# Altium schematic symbol library Schlib.SchLib: 725 symbols (part 5 of 6) (continued)
## SN74LVC1G06DCKR
designator U?  (value not drawn)
Inverter IC 1 Channel Open Drain SC-70-5; Manufacturer: Texas Instruments; Manufacturer Part Number: SN74LVC1G06DCKR; Logic Function: Buffer,Inverting; Number of Inputs: 1; Max Supply Voltage: 5.5V; Min Supply Voltage: 1.65V; Propagation Delay: 3ns; Quiescent Current: 10uA; Low Level Output Current: 32mA; Polarity: Inverting; Turn-On Delay Time: 6.5ns; Supplier: Digi-Key; Supplier Part Number: 296-8484-1-ND; RoHS: Yes; Category: Buffers, Drivers and Transceivers; Stock: 365; Pricing: 1=0.38000, 10=0.31100, 25=0.26040, 100=0.16490, 250=0.12728, 500=0.10848, 1000=0.07376 (USD); Mounting Technology: Surface Mount; Case/Package: SC; Pins: 5; Contact Plating: Gold; Min Operating Temperature: -40°C; Max Operating Temperature: 125°C; Packaging: Tape and Reel; Package Quantity: 3000; Number of Circuits: 1; Number of Elements: 1; Number of Gates: 1; Number of Bits: 1; Series: 74LVC; Technology: CMOS; Number of Channels: 1; Number of Outputs: 1; Number of Input Lines: 1; Number of Output Lines: 1; Output Current: 32mA; High Level Output Current: 32mA; Number of Bits per Element: 1; Length: 2mm; Width: 1.25mm; Height: 0.9mm; Radiation Hardening: No; Lead Free: Lead Free; RoHS Compliant: Yes; Reach SVHC Compliant: Yes; ComponentLink1URL: https://datasheet.ciiva.com/34301/1043820-34301914.pdf?src-supplier=Jameco; ComponentLink1Description: https://datasheet.ciiva.com/34301/1043820-34301914.pdf?src-supplier=Jameco; ComponentLink2URL: https://datasheet.ciiva.com/15094/getdatasheetpartid-76668-15094547.pdf?src-supplier=Verical; ComponentLink2Description: https://datasheet.ciiva.com/15094/getdatasheetpartid-76668-15094547.pdf?src-supplier=Verical; ComponentLink3URL: https://datasheet.ciiva.com/7783/1633749-7783590.pdf?src-supplier=Element14; ComponentLink3Description: https://datasheet.ciiva.com/7783/1633749-7783590.pdf?src-supplier=Element14; ComponentLink4URL: https://datasheet.ciiva.com/46442/1857056-46442057.pdf?src-supplier=Element14; ComponentLink4Description: https://datasheet.ciiva.com/46442/1857056-46442057.pdf?src-supplier=Element14; ComponentLink5URL: https://datasheet.ciiva.com/1864/sn74lvc1g06-1864402.pdf?src-supplier=Digi-Key; ComponentLink5Description: https://datasheet.ciiva.com/1864/sn74lvc1g06-1864402.pdf?src-supplier=Digi-Key; ComponentLink6URL: https://datasheet.ciiva.com/1864/sn74lvc1g06-1864401.pdf?src-supplier=Digi-Key; ComponentLink6Description: https://datasheet.ciiva.com/1864/sn74lvc1g06-1864401.pdf?src-supplier=Digi-Key; ComponentLink7URL: https://datasheet.ciiva.com/1864/sn74lvc1g06-1864403.pdf?src-supplier=Digi-Key; ComponentLink7Description: https://datasheet.ciiva.com/1864/sn74lvc1g06-1864403.pdf?src-supplier=Digi-Key
footprint SC-70-5
pins: 1 NC, 2 IN, 3 GND, 4 OUT, 5 VDD

## SN74LVC1G14QDCKRQ1
designator U?
Automotive single 1.65-V to 5.5-V inverter with Schmitt-Trigger inputs 5-SC70 -40 to 125; Manufacturer: Texas Instruments; Manufacturer Part Number: SN74LVC1G14QDCKRQ1; Manufacturer Lifecycle Status: ACTIVE; High Level Output Current: 32mA; Number of Bits: 1; Propagation Delay: 6ns; Quiescent Current: 10µA; Supplier: Arrow Electronics; Supplier Part Number: SN74LVC1G14QDCKRQ1; RoHS: Compliant; Category: Logic Gates; Stock: 6000; Pricing: 3000=0.1184, 6000=0.1097 (USD); Height: 1.1mm; Lead Free: Lead Free; Length: 2mm; Lifecycle Status: Production; Logic Function: Inverter; Low Level Output Current: 32mA; Max Operating Temperature: 125°C; Min Operating Temperature: -40°C; Mounting Technology: Surface Mount; Number of Channels: 1; Number of Circuits: 1; Number of Inputs: 1; Number of Outputs: 1; Pins: 5; Packaging: Tape & Reel (TR); Schedule B: 8542390000; Thickness: 900µm; Width: 1.25mm; ComponentLink1URL: https://sigma.octopart.com:443/182282879/technical_drawing/Texas-Instruments-SN74LVC1G14QDCKRQ1.pdf?src-supplier=Texas+Instruments; ComponentLink1Description: https://sigma.octopart.com:443/182282879/technical_drawing/Texas-Instruments-SN74LVC1G14QDCKRQ1.pdf?src-supplier=Texas+Instruments; ComponentLink2URL: https://octopart.com:443/opatz8j6/c1?t=U1LMfQ56LyeyUG5Y4b6cngpQ5JkKyWGfgRvG9hLlQAWevraWS6dPVHoKD8UD42W17Ftg6QB904-I0RVjOt0vzRvqwagTP4tDRJEozQC8SMRx5pi6hHnU7hc6kQ0D0ugqyMBQWFLFIEd4Bknu6ewOwAUrQRkAodPNYxL-9mlNF-WlI8emsuFFNSkNGoJA9xeI0UkoxdXIukTa1c4BW7cp62KtBfKQTgFwx6a1twekbOYut9D9a9xfIV4LmNRg1ArGnMB1Zd4pKakrJIcb0nauSqbMuVdvadi7FrMB_1zO3pMxSr5NQpaXCcOnIT5BmSZUZ496w0UnMKb4XmwBOW_kvpePxWxk2_q0hsWCR3bKlWY2bjyXu1ZEOVibRalMkkX6ztmV34tRU0Y171_2&src-supplier=Texas+Instruments; ComponentLink2Description: https://octopart.com:443/opatz8j6/c1?t=U1LMfQ56LyeyUG5Y4b6cngpQ5JkKyWGfgRvG9hLlQAWevraWS6dPVHoKD8UD42W17Ftg6QB904-I0RVjOt0vzRvqwagTP4tDRJEozQC8SMRx5pi6hHnU7hc6kQ0D0ugqyMBQWFLFIEd4Bknu6ewOwAUrQRkAodPNYxL-9mlNF-WlI8emsuFFNSkNGoJA9xeI0UkoxdXIukTa1c4BW7cp62KtBfKQTgFwx6a1twekbOYut9D9a9xfIV4LmNRg1ArGnMB1Zd4pKakrJIcb0nauSqbMuVdvadi7FrMB_1zO3pMxSr5NQpaXCcOnIT5BmSZUZ496w0UnMKb4XmwBOW_kvpePxWxk2_q0hsWCR3bKlWY2bjyXu1ZEOVibRalMkkX6ztmV34tRU0Y171_2&src-supplier=Texas+Instruments; ComponentLink3URL: https://sigma.octopart.com:443/179129132/technical_drawing/Texas-Instruments-SN74LVC1G14QDCKRQ1.pdf?src-supplier=Texas+Instruments; ComponentLink3Description: https://sigma.octopart.com:443/179129132/technical_drawing/Texas-Instruments-SN74LVC1G14QDCKRQ1.pdf?src-supplier=Texas+Instruments; ComponentLink4URL: https://sigma.octopart.com:443/176385615/technical_drawing/Texas-Instruments-SN74LVC1G14QDCKRQ1.pdf?src-supplier=Texas+Instruments; ComponentLink4Description: https://sigma.octopart.com:443/176385615/technical_drawing/Texas-Instruments-SN74LVC1G14QDCKRQ1.pdf?src-supplier=Texas+Instruments; ComponentLink5URL: https://sigma.octopart.com:443/169406035/technical_drawing/Texas-Instruments-SN74LVC1G14QDCKRQ1.pdf?src-supplier=Texas+Instruments; ComponentLink5Description: https://sigma.octopart.com:443/169406035/technical_drawing/Texas-Instruments-SN74LVC1G14QDCKRQ1.pdf?src-supplier=Texas+Instruments; ComponentLink6URL: https://datasheet.octopart.com:443/SN74LVC1G14QDCKRQ1-Texas-Instruments-datasheet-37538580.pdf?src-supplier=Texas+Instruments; ComponentLink6Description: https://datasheet.octopart.com:443/SN74LVC1G14QDCKRQ1-Texas-Instruments-datasheet-37538580.pdf?src-supplier=Texas+Instruments; ComponentLink7URL: https://sigma.octopart.com:443/49249326/technical_drawing/Texas-Instruments-SN74LVC1G14QDCKRQ1.pdf?src-supplier=Texas+Instruments; ComponentLink7Description: https://sigma.octopart.com:443/49249326/technical_drawing/Texas-Instruments-SN74LVC1G14QDCKRQ1.pdf?src-supplier=Texas+Instruments; ComponentLink8URL: https://datasheet.octopart.com:443/SN74LVC1G14QDCKRQ1-Texas-Instruments-datasheet-164417655.pdf?src-supplier=SHENGYU+ELECTRONICS; ComponentLink8Description: https://datasheet.octopart.com:443/SN74LVC1G14QDCKRQ1-Texas-Instruments-datasheet-164417655.pdf?src-supplier=SHENGYU+ELECTRONICS; ComponentLink9URL: https://datasheet.octopart.com:443/SN74LVC1G14QDCKRQ1-Texas-Instruments-datasheet-163726857.pdf?src-supplier=LCSC; ComponentLink9Description: https://datasheet.octopart.com:443/SN74LVC1G14QDCKRQ1-Texas-Instruments-datasheet-163726857.pdf?src-supplier=LCSC; ComponentLink10URL: https://datasheet.octopart.com:443/SN74LVC1G14QDCKRQ1-Texas-Instruments-datasheet-142046494.pdf?src-supplier=Arrow.cn; ComponentLink10Description: https://datasheet.octopart.com:443/SN74LVC1G14QDCKRQ1-Texas-Instruments-datasheet-142046494.pdf?src-supplier=Arrow.cn; ComponentLink11URL: http://sigma.octopart.com:80/reach_statement/Texas-Instruments-company-64.pdf?src-supplier=Compliance+Statements; ComponentLink11Description: http://sigma.octopart.com:80/reach_statement/Texas-Instruments-company-64.pdf?src-supplier=Compliance+Statements; ComponentLink12URL: http://sigma.octopart.com:80/conflict_mineral_statement/Texas-Instruments-company-63.pdf?src-supplier=Compliance+Statements; ComponentLink12Description: http://sigma.octopart.com:80/conflict_mineral_statement/Texas-Instruments-company-63.pdf?src-supplier=Compliance+Statements
footprint DCK5_TEX
pins: 1 NC, 2 IN (in), 3 GND, 4 OUT (out), 5 VCC

## SN74LVC1G32DCKT
designator U?
1-ch, 2-input 1.65-V to 5.5-V 32-mA drive strength OR gate 5-SC70 -40 to 125; Manufacturer: Texas Instruments; Manufacturer Part Number: SN74LVC1G32DCKT; Manufacturer Lifecycle Status: ACTIVE; Frequency: 100MHz; High Level Output Current: -32mA; Low Level Output Current: 32mA; Max Junction Temperature (Tj): 150°C; Max Supply Voltage: 5.5V; Min Supply Voltage: 1.65V; Nominal Supply Current: 10µA; Number of Bits: 1; Number of Input Lines: 2; Operating Supply Voltage: 3.3V; Propagation Delay: 4.5ns; Schmitt Trigger Input: No; Supplier: Mouser; Supplier Part Number: 595-SN74LVC1G32DCKT; RoHS: Compliant; Category: Logic Gates; Stock: 1631; Pricing: 1=0.83, 10=0.59, 50=0.531, 100=0.466, 1000=0.384, 10000=0.363 (USD); Ambient Temperature Range High: 125°C; Case/Package: SC; Contact Plating: Gold; Height: 1.1mm; Lead Free: Lead Free; Length: 2mm; Lifecycle Status: Production; Logic Function: OR; Max Operating Temperature: 125°C; Max Output current: 32mA; Min Operating Temperature: -40°C; Mounting Technology: Surface Mount; Number of Channels: 1; Number of Circuits: 1; Number of Elements: 1; Number of Gates: 1; Number of Inputs: 2; Number of Output Lines: 1; Number of Outputs: 1; Pins: 5; Output Current: 32mA; Quiescent Current: 10µA; Radiation Hardening: No; REACH SVHC: No; Schedule B: 8542390000, 8542390000|8542390000|8542390000|8542390000|8542390000; Termination: SMD/SMT; Thickness: 900µm; Turn-On Delay Time: 4.5ns; Weight: 2.494758mg; Width: 1.25mm; ComponentLink1URL: https://sigma.octopart.com:443/182282879/technical_drawing/Texas-Instruments-SN74LVC1G32DCKT.pdf?src-supplier=Texas+Instruments; ComponentLink1Description: https://sigma.octopart.com:443/182282879/technical_drawing/Texas-Instruments-SN74LVC1G32DCKT.pdf?src-supplier=Texas+Instruments; ComponentLink2URL: https://octopart.com:443/opatz8j6/c1?t=rAITI4QwbW4FpwhT6HFWelN2Gah5uZ4XhCUEPN3mm1eiMsylUgdGbohF32qWzQW7A6NoWiLBGkQ81fWadFdnS6BCCWdna0BhpcwqqO3gXsfgtYNZFvbCFYsA3GKbVc_B0BliRUpCimSoX7Rd0nZdHLR4ot09PzmCO6Vl8HQzUZsOgWN7xof43mk2YXqqYknWkDaj1UjTN54UqNcYeshF40Mv3zEu1_pPM2oLBoc8u8ZahoYKBYbjBr1lnNnXB-W3mThCqVs9PNfg4zqWgOsFbQJfVtYn74HA1rX7MA0pUxWkGOXsGdj1hS1oov9Vxb8hZ-5jVVrJvH-msINucWBGyi1HtkDZ0bsHVZRz9zflGjuwobzqfU56h-aLiWVlLVHo3nlkGm60ULw&src-supplier=Texas+Instruments; ComponentLink2Description: https://octopart.com:443/opatz8j6/c1?t=rAITI4QwbW4FpwhT6HFWelN2Gah5uZ4XhCUEPN3mm1eiMsylUgdGbohF32qWzQW7A6NoWiLBGkQ81fWadFdnS6BCCWdna0BhpcwqqO3gXsfgtYNZFvbCFYsA3GKbVc_B0BliRUpCimSoX7Rd0nZdHLR4ot09PzmCO6Vl8HQzUZsOgWN7xof43mk2YXqqYknWkDaj1UjTN54UqNcYeshF40Mv3zEu1_pPM2oLBoc8u8ZahoYKBYbjBr1lnNnXB-W3mThCqVs9PNfg4zqWgOsFbQJfVtYn74HA1rX7MA0pUxWkGOXsGdj1hS1oov9Vxb8hZ-5jVVrJvH-msINucWBGyi1HtkDZ0bsHVZRz9zflGjuwobzqfU56h-aLiWVlLVHo3nlkGm60ULw&src-supplier=Texas+Instruments; ComponentLink3URL: https://sigma.octopart.com:443/179129132/technical_drawing/Texas-Instruments-SN74LVC1G32DCKT.pdf?src-supplier=Texas+Instruments; ComponentLink3Description: https://sigma.octopart.com:443/179129132/technical_drawing/Texas-Instruments-SN74LVC1G32DCKT.pdf?src-supplier=Texas+Instruments; ComponentLink4URL: https://sigma.octopart.com:443/176385615/technical_drawing/Texas-Instruments-SN74LVC1G32DCKT.pdf?src-supplier=Texas+Instruments; ComponentLink4Description: https://sigma.octopart.com:443/176385615/technical_drawing/Texas-Instruments-SN74LVC1G32DCKT.pdf?src-supplier=Texas+Instruments; ComponentLink5URL: https://sigma.octopart.com:443/169406035/technical_drawing/Texas-Instruments-SN74LVC1G32DCKT.pdf?src-supplier=Texas+Instruments; ComponentLink5Description: https://sigma.octopart.com:443/169406035/technical_drawing/Texas-Instruments-SN74LVC1G32DCKT.pdf?src-supplier=Texas+Instruments; ComponentLink6URL: https://datasheet.octopart.com:443/SN74LVC1G32DCKT-Texas-Instruments-datasheet-24565372.pdf?src-supplier=Texas+Instruments; ComponentLink6Description: https://datasheet.octopart.com:443/SN74LVC1G32DCKT-Texas-Instruments-datasheet-24565372.pdf?src-supplier=Texas+Instruments; ComponentLink7URL: https://datasheet.octopart.com:443/SN74LVC1G32DCKT-Texas-Instruments-datasheet-16617162.pdf?src-supplier=Texas+Instruments; ComponentLink7Description: https://datasheet.octopart.com:443/SN74LVC1G32DCKT-Texas-Instruments-datasheet-16617162.pdf?src-supplier=Texas+Instruments; ComponentLink8URL: https://datasheet.octopart.com:443/SN74LVC1G32DCKT-Texas-Instruments-datasheet-15994557.pdf?src-supplier=Texas+Instruments; ComponentLink8Description: https://datasheet.octopart.com:443/SN74LVC1G32DCKT-Texas-Instruments-datasheet-15994557.pdf?src-supplier=Texas+Instruments; ComponentLink9URL: https://datasheet.octopart.com:443/SN74LVC1G32DCKT-Texas-Instruments-datasheet-13041517.pdf?src-supplier=Texas+Instruments; ComponentLink9Description: https://datasheet.octopart.com:443/SN74LVC1G32DCKT-Texas-Instruments-datasheet-13041517.pdf?src-supplier=Texas+Instruments; ComponentLink10URL: https://datasheet.octopart.com:443/SN74LVC1G32DCKT-Texas-Instruments-datasheet-11479365.pdf?src-supplier=Texas+Instruments; ComponentLink10Description: https://datasheet.octopart.com:443/SN74LVC1G32DCKT-Texas-Instruments-datasheet-11479365.pdf?src-supplier=Texas+Instruments; ComponentLink11URL: https://datasheet.octopart.com:443/SN74LVC1G32DCKT-Texas-Instruments-datasheet-10884951.pdf?src-supplier=Texas+Instruments; ComponentLink11Description: https://datasheet.octopart.com:443/SN74LVC1G32DCKT-Texas-Instruments-datasheet-10884951.pdf?src-supplier=Texas+Instruments; ComponentLink12URL: https://datasheet.octopart.com:443/SN74LVC1G32DCKT-Texas-Instruments-datasheet-10627501.pdf?src-supplier=Texas+Instruments; ComponentLink12Description: https://datasheet.octopart.com:443/SN74LVC1G32DCKT-Texas-Instruments-datasheet-10627501.pdf?src-supplier=Texas+Instruments; ComponentLink13URL: https://datasheet.octopart.com:443/SN74LVC1G32DCKT-Texas-Instruments-datasheet-152691.pdf?src-supplier=Texas+Instruments; ComponentLink13Description: https://datasheet.octopart.com:443/SN74LVC1G32DCKT-Texas-Instruments-datasheet-152691.pdf?src-supplier=Texas+Instruments; ComponentLink14URL: https://sigma.octopart.com:443/49249326/technical_drawing/Texas-Instruments-SN74LVC1G32DCKT.pdf?src-supplier=Texas+Instruments; ComponentLink14Description: https://sigma.octopart.com:443/49249326/technical_drawing/Texas-Instruments-SN74LVC1G32DCKT.pdf?src-supplier=Texas+Instruments; ComponentLink15URL: https://datasheet.octopart.com:443/SN74LVC1G32DCKT-Texas-Instruments-datasheet-149157257.pdf?src-supplier=Upverter; ComponentLink15Description: https://datasheet.octopart.com:443/SN74LVC1G32DCKT-Texas-Instruments-datasheet-149157257.pdf?src-supplier=Upverter; ComponentLink16URL: https://datasheet.octopart.com:443/SN74LVC1G32DCKT-Texas-Instruments-datasheet-65713484.pdf?src-supplier=Newark; ComponentLink16Description: https://datasheet.octopart.com:443/SN74LVC1G32DCKT-Texas-Instruments-datasheet-65713484.pdf?src-supplier=Newark; ComponentLink17URL: https://datasheet.octopart.com:443/SN74LVC1G32DCKT-Texas-Instruments-datasheet-547111.pdf?src-supplier=Newark; ComponentLink17Description: https://datasheet.octopart.com:443/SN74LVC1G32DCKT-Texas-Instruments-datasheet-547111.pdf?src-supplier=Newark; ComponentLink18URL: https://datasheet.octopart.com:443/SN74LVC1G32DCKT-Texas-Instruments-datasheet-21259391.pdf?src-supplier=Newark; ComponentLink18Description: https://datasheet.octopart.com:443/SN74LVC1G32DCKT-Texas-Instruments-datasheet-21259391.pdf?src-supplier=Newark; ComponentLink19URL: https://datasheet.octopart.com:443/SN74LVC1G32DCKT-Texas-Instruments-datasheet-10408086.pdf?src-supplier=Newark; ComponentLink19Description: https://datasheet.octopart.com:443/SN74LVC1G32DCKT-Texas-Instruments-datasheet-10408086.pdf?src-supplier=Newark; ComponentLink20URL: https://datasheet.octopart.com:443/SN74LVC1G32DCKT-Texas-Instruments-datasheet-8772557.pdf?src-supplier=Newark; ComponentLink20Description: https://datasheet.octopart.com:443/SN74LVC1G32DCKT-Texas-Instruments-datasheet-8772557.pdf?src-supplier=Newark; ComponentLink21URL: https://datasheet.octopart.com:443/SN74LVC1G32DCKT-Texas-Instruments-datasheet-8530729.pdf?src-supplier=Newark; ComponentLink21Description: https://datasheet.octopart.com:443/SN74LVC1G32DCKT-Texas-Instruments-datasheet-8530729.pdf?src-supplier=Newark; ComponentLink22URL: https://datasheet.octopart.com:443/SN74LVC1G32DCKT-Texas-Instruments-datasheet-5312626.pdf?src-supplier=Newark; ComponentLink22Description: https://datasheet.octopart.com:443/SN74LVC1G32DCKT-Texas-Instruments-datasheet-5312626.pdf?src-supplier=Newark; ComponentLink23URL: https://datasheet.octopart.com:443/SN74LVC1G32DCKT-Texas-Instruments-datasheet-164417659.pdf?src-supplier=SHENGYU+ELECTRONICS; ComponentLink23Description: https://datasheet.octopart.com:443/SN74LVC1G32DCKT-Texas-Instruments-datasheet-164417659.pdf?src-supplier=SHENGYU+ELECTRONICS; ComponentLink24URL: https://datasheet.octopart.com:443/SN74LVC1G32DCKT-.-Texas-Instruments-datasheet-33018804.pdf?src-supplier=element14+APAC; ComponentLink24Description: https://datasheet.octopart.com:443/SN74LVC1G32DCKT-.-Texas-Instruments-datasheet-33018804.pdf?src-supplier=element14+APAC; ComponentLink25URL: https://datasheet.octopart.com:443/SN74LVC1G32DCKT-Texas-Instruments-datasheet-11625372.pdf?src-supplier=Arrow+Electronics; ComponentLink25Description: https://datasheet.octopart.com:443/SN74LVC1G32DCKT-Texas-Instruments-datasheet-11625372.pdf?src-supplier=Arrow+Electronics; ComponentLink26URL: https://datasheet.octopart.com:443/SN74LVC1G32DCKT-Texas-Instruments-datasheet-10409013.pdf?src-supplier=Farnell; ComponentLink26Description: https://datasheet.octopart.com:443/SN74LVC1G32DCKT-Texas-Instruments-datasheet-10409013.pdf?src-supplier=Farnell; ComponentLink27URL: https://datasheet.octopart.com:443/SN74LVC1G32DCKT-Texas-Instruments-datasheet-8369713.pdf?src-supplier=Farnell; ComponentLink27Description: https://datasheet.octopart.com:443/SN74LVC1G32DCKT-Texas-Instruments-datasheet-8369713.pdf?src-supplier=Farnell; ComponentLink28URL: https://datasheet.octopart.com:443/SN74LVC1G32DCKT-Texas-Instruments-datasheet-7599405.pdf?src-supplier=Farnell; ComponentLink28Description: https://datasheet.octopart.com:443/SN74LVC1G32DCKT-Texas-Instruments-datasheet-7599405.pdf?src-supplier=Farnell; ComponentLink29URL: https://datasheet.octopart.com:443/SN74LVC1G32DCKT-Texas-Instruments-datasheet-5304256.pdf?src-supplier=Farnell; ComponentLink29Description: https://datasheet.octopart.com:443/SN74LVC1G32DCKT-Texas-Instruments-datasheet-5304256.pdf?src-supplier=Farnell; ComponentLink30URL: https://datasheet.octopart.com:443/SN74LVC1G32DCKT-Texas-Instruments-datasheet-8442752.pdf?src-supplier=Jameco; ComponentLink30Description: https://datasheet.octopart.com:443/SN74LVC1G32DCKT-Texas-Instruments-datasheet-8442752.pdf?src-supplier=Jameco; ComponentLink31URL: https://datasheet.octopart.com:443/SN74LVC1G32DCKT-Texas-Instruments-datasheet-32234.pdf?src-supplier=Sierra+IC; ComponentLink31Description: https://datasheet.octopart.com:443/SN74LVC1G32DCKT-Texas-Instruments-datasheet-32234.pdf?src-supplier=Sierra+IC; ComponentLink32URL: http://sigma.octopart.com:80/reach_statement/Texas-Instruments-company-64.pdf?src-supplier=Compliance+Statements; ComponentLink32Description: http://sigma.octopart.com:80/reach_statement/Texas-Instruments-company-64.pdf?src-supplier=Compliance+Statements; ComponentLink33URL: http://sigma.octopart.com:80/conflict_mineral_statement/Texas-Instruments-company-63.pdf?src-supplier=Compliance+Statements; ComponentLink33Description: http://sigma.octopart.com:80/conflict_mineral_statement/Texas-Instruments-company-63.pdf?src-supplier=Compliance+Statements
footprint DCK5_TEX
part A pins: 1 (in), 2 (in), 4 (out)
part B pins: 3 GND, 5 VCC

## SN74LVC1G125DCKR
designator U?  (value not drawn)
IC BUS BUFF TRI-ST N-INV SC70-5; Manufacturer: Texas Instruments; Manufacturer Part Number: SN74LVC1G125DCKR; Min Supply Voltage: 1.65V; Max Supply Voltage: 5.5V; Logic Function: Buffer,Inverting; Propagation Delay: 10.1ns; Number of Channels: 1; Low Level Output Current: 32mA; Polarity: Non-Inverting; High Level Output Current: -32mA; Turn-On Delay Time: 4.5ns; Quiescent Current: 10uA; Output Type: 3-STATE; Frequency: 150MHz; Number of Circuits: 1NUMBER; Supplier: Mouser; Supplier Part Number: 595-SN74LVC1G125DCKR; RoHS: Yes; Category: Buffers, Drivers and Transceivers; Stock: 544427; Pricing: 1=0.33, 10=0.228, 50=0.228, 100=0.095, 1000=0.075, 10000=0.055 (USD); Mounting Technology: Surface Mount; Case/Package: SC; Pins: 5; Min Operating Temperature: -40°C; Max Operating Temperature: 125°C; Packaging: Tape and Reel; Package Quantity: 3000; Number of Inputs: 1; Number of Outputs: 1; Number of Elements: 1; Number of Input Lines: 1; Number of Output Lines: 1; Number of Bits per Element: 1; Termination: SMD/SMT; Number of Bits: 1; Series: 74LVC; Technology: CMOS; Number of Gates: 1NUMBER; Length: 2mm; Width: 1.25mm; Height: 0.9mm; Thickness: 900um; Radiation Hardening: No; RoHS Compliant: Yes; Reach SVHC Compliant: No; Lead Free: 5697LeadFree; ComponentLink1URL: https://datasheet.ciiva.com/23943/1772546-23943376.pdf?src-supplier=Newark; ComponentLink1Description: https://datasheet.ciiva.com/23943/1772546-23943376.pdf?src-supplier=Newark; ComponentLink2URL: https://datasheet.ciiva.com/15094/getdatasheetpartid-189691-15094950.pdf?src-supplier=Verical; ComponentLink2Description: https://datasheet.ciiva.com/15094/getdatasheetpartid-189691-15094950.pdf?src-supplier=Verical; ComponentLink3URL: https://datasheet.ciiva.com/7743/1804932-7743992.pdf?src-supplier=Element14; ComponentLink3Description: https://datasheet.ciiva.com/7743/1804932-7743992.pdf?src-supplier=Element14; ComponentLink4URL: https://datasheet.ciiva.com/7743/1804932-7743993.pdf?src-supplier=Element14; ComponentLink4Description: https://datasheet.ciiva.com/7743/1804932-7743993.pdf?src-supplier=Element14; ComponentLink5URL: https://datasheet.ciiva.com/28594/1772546-28594796.pdf?src-supplier=Element14; ComponentLink5Description: https://datasheet.ciiva.com/28594/1772546-28594796.pdf?src-supplier=Element14; ComponentLink6URL: https://datasheet.ciiva.com/1839/sn74lvc1g125-1839609.pdf?src-supplier=Digikey; ComponentLink6Description: https://datasheet.ciiva.com/1839/sn74lvc1g125-1839609.pdf?src-supplier=Digikey; ComponentLink7URL: https://datasheet.ciiva.com/1839/sn74lvc1g125-1839608.pdf?src-supplier=Digikey; ComponentLink7Description: https://datasheet.ciiva.com/1839/sn74lvc1g125-1839608.pdf?src-supplier=Digikey; ComponentLink8URL: https://datasheet.ciiva.com/1839/sn74lvc1g125-1839610.pdf?src-supplier=Digikey; ComponentLink8Description: https://datasheet.ciiva.com/1839/sn74lvc1g125-1839610.pdf?src-supplier=Digikey; ComponentLink9URL: https://datasheet.ciiva.com/14301/sn74lvc1g125-14301014.pdf?src-supplier=Avnet; ComponentLink9Description: https://datasheet.ciiva.com/14301/sn74lvc1g125-14301014.pdf?src-supplier=Avnet
footprint SC-70-5
pins: 1 ~{OE}, 2 IN, 3 GND, 4 Out, 5 VCC

## SN74LVC1G240DBVR
designator U?  (value not drawn)
Buffer/Line Driver 1-CH Inverting 3-ST CMOS 5-Pin SOT-23 T/R / IC BUFF INVERT 3ST 5.5V SOT23-5; Manufacturer: Texas Instruments; Manufacturer Part Number: SN74LVC1G240DBVR; Manufacturer Lifecycle Status: ACTIVE; High Level Output Current: -32mA; Logic Function: Buffer, Inverter; Low Level Output Current: 32mA; Min Supply Voltage: 1.65V; Number of Bits: 1; Number of Inputs: 2; Propagation Delay: 4.2ns; Quiescent Current: 10µA; Turn-On Delay Time: 10ns; Supplier: Mouser; Supplier Part Number: 595-SN74LVC1G240DBVR; RoHS: Compliant; Category: Buffers, Drivers and Transceivers; Stock: 28850; Pricing: 1=0.25, 10=0.173, 50=0.152, 100=0.13, 1000=0.108, 10000=0.097 (USD); Ambient Temperature Range High: 125°C; Case/Package: SOT-23; Height: 1.45mm; Lead Free: Lead Free; Length: 2.9mm; Lifecycle Status: Production; Max Operating Temperature: 125°C; Max Supply Voltage: 5.5V; Min Operating Temperature: -40°C; Mounting Technology: Surface Mount; Number of Channels: 1; Number of Circuits: 1; Number of Elements: 1; Number of Gates: 1; Number of Input Lines: 1; Number of Output Lines: 1; Number of Outputs: 1; Pins: 5; Packaging: Cut Tape; Polarity: Inverting; Radiation Hardening: No; REACH SVHC: No; Schedule B: 8542390000, 8542390000|8542390000|8542390000|8542390000|8542390000; Thickness: 1.2mm; Width: 1.6mm; ComponentLink1URL: https://sigma.octopart.com:443/177332311/technical_drawing/Texas-Instruments-SN74LVC1G240DBVR.pdf?src-supplier=Texas+Instruments; ComponentLink1Description: https://sigma.octopart.com:443/177332311/technical_drawing/Texas-Instruments-SN74LVC1G240DBVR.pdf?src-supplier=Texas+Instruments; ComponentLink2URL: https://octopart.com:443/opatz8j6/c1?t=u1dRkrIhsedspNUt5me-FCVr5XhdK8UwCMwvxU0aM2ptw9nrBTsPCfYYPYRWE8ateER56si98oAOs3-6BS0qpoEMxmKrJMwVmGhc6Tm_jVFbjohWwi0HPV3MXQhtLQjioTCHdviajhJo575IBJH_DNkZOAVzmpdLsWorVgT8ZUElatbZHBDtMD9Cdm5l58YMKO_hBRp8jidqAbSozVAWK3NcCXaPhkVc535wAK22J6_jYGCfkRkBl4a22d3ufiZERMpZQipeCtDapeyfIY5Mj7NdgSVKXwAuoNu0rUD8q30F56ZQycJ3RBAYsNTdQYvg3Gmvo3VF83lW9s9JGiujfjmVeAhtNbYRWQny0Qmz9lqQul7-iWLhInr7ZKJhg0PAKDFvuAAI7sE&src-supplier=Texas+Instruments; ComponentLink2Description: https://octopart.com:443/opatz8j6/c1?t=u1dRkrIhsedspNUt5me-FCVr5XhdK8UwCMwvxU0aM2ptw9nrBTsPCfYYPYRWE8ateER56si98oAOs3-6BS0qpoEMxmKrJMwVmGhc6Tm_jVFbjohWwi0HPV3MXQhtLQjioTCHdviajhJo575IBJH_DNkZOAVzmpdLsWorVgT8ZUElatbZHBDtMD9Cdm5l58YMKO_hBRp8jidqAbSozVAWK3NcCXaPhkVc535wAK22J6_jYGCfkRkBl4a22d3ufiZERMpZQipeCtDapeyfIY5Mj7NdgSVKXwAuoNu0rUD8q30F56ZQycJ3RBAYsNTdQYvg3Gmvo3VF83lW9s9JGiujfjmVeAhtNbYRWQny0Qmz9lqQul7-iWLhInr7ZKJhg0PAKDFvuAAI7sE&src-supplier=Texas+Instruments; ComponentLink3URL: https://sigma.octopart.com:443/175570406/technical_drawing/Texas-Instruments-SN74LVC1G240DBVR.pdf?src-supplier=Texas+Instruments; ComponentLink3Description: https://sigma.octopart.com:443/175570406/technical_drawing/Texas-Instruments-SN74LVC1G240DBVR.pdf?src-supplier=Texas+Instruments; ComponentLink4URL: https://sigma.octopart.com:443/169406034/technical_drawing/Texas-Instruments-SN74LVC1G240DBVR.pdf?src-supplier=Texas+Instruments; ComponentLink4Description: https://sigma.octopart.com:443/169406034/technical_drawing/Texas-Instruments-SN74LVC1G240DBVR.pdf?src-supplier=Texas+Instruments; ComponentLink5URL: https://sigma.octopart.com:443/155939316/technical_drawing/Texas-Instruments-SN74LVC1G240DBVR.pdf?src-supplier=Texas+Instruments; ComponentLink5Description: https://sigma.octopart.com:443/155939316/technical_drawing/Texas-Instruments-SN74LVC1G240DBVR.pdf?src-supplier=Texas+Instruments; ComponentLink6URL: https://sigma.octopart.com:443/102331370/technical_drawing/Texas-Instruments-SN74LVC1G240DBVR.pdf?src-supplier=Texas+Instruments; ComponentLink6Description: https://sigma.octopart.com:443/102331370/technical_drawing/Texas-Instruments-SN74LVC1G240DBVR.pdf?src-supplier=Texas+Instruments; ComponentLink7URL: https://datasheet.octopart.com:443/SN74LVC1G240DBVR-Texas-Instruments-datasheet-37730983.pdf?src-supplier=Texas+Instruments; ComponentLink7Description: https://datasheet.octopart.com:443/SN74LVC1G240DBVR-Texas-Instruments-datasheet-37730983.pdf?src-supplier=Texas+Instruments; ComponentLink8URL: https://sigma.octopart.com:443/49249325/technical_drawing/Texas-Instruments-SN74LVC1G240DBVR.pdf?src-supplier=Texas+Instruments; ComponentLink8Description: https://sigma.octopart.com:443/49249325/technical_drawing/Texas-Instruments-SN74LVC1G240DBVR.pdf?src-supplier=Texas+Instruments; ComponentLink9URL: https://datasheet.octopart.com:443/SN74LVC1G240DBVR-Texas-Instruments-datasheet-10899258.pdf?src-supplier=Texas+Instruments; ComponentLink9Description: https://datasheet.octopart.com:443/SN74LVC1G240DBVR-Texas-Instruments-datasheet-10899258.pdf?src-supplier=Texas+Instruments; ComponentLink10URL: https://datasheet.octopart.com:443/SN74LVC1G240DBVR-Texas-Instruments-datasheet-152644.pdf?src-supplier=Texas+Instruments; ComponentLink10Description: https://datasheet.octopart.com:443/SN74LVC1G240DBVR-Texas-Instruments-datasheet-152644.pdf?src-supplier=Texas+Instruments; ComponentLink11URL: https://datasheet.octopart.com:443/SN74LVC1G240DBVR-Texas-Instruments-datasheet-21255438.pdf?src-supplier=Newark; ComponentLink11Description: https://datasheet.octopart.com:443/SN74LVC1G240DBVR-Texas-Instruments-datasheet-21255438.pdf?src-supplier=Newark; ComponentLink12URL: https://datasheet.octopart.com:443/SN74LVC1G240DBVR-Texas-Instruments-datasheet-8546236.pdf?src-supplier=Newark; ComponentLink12Description: https://datasheet.octopart.com:443/SN74LVC1G240DBVR-Texas-Instruments-datasheet-8546236.pdf?src-supplier=Newark; ComponentLink13URL: https://datasheet.octopart.com:443/SN74LVC1G240DBVR-Texas-Instruments-datasheet-5313453.pdf?src-supplier=Newark; ComponentLink13Description: https://datasheet.octopart.com:443/SN74LVC1G240DBVR-Texas-Instruments-datasheet-5313453.pdf?src-supplier=Newark; ComponentLink14URL: https://datasheet.octopart.com:443/SN74LVC1G240DBVR-Texas-Instruments-datasheet-21221586.pdf?src-supplier=Upverter; ComponentLink14Description: https://datasheet.octopart.com:443/SN74LVC1G240DBVR-Texas-Instruments-datasheet-21221586.pdf?src-supplier=Upverter; ComponentLink15URL: https://datasheet.octopart.com:443/SN74LVC1G240DBVR-Texas-Instruments-datasheet-164412143.pdf?src-supplier=LCSC; ComponentLink15Description: https://datasheet.octopart.com:443/SN74LVC1G240DBVR-Texas-Instruments-datasheet-164412143.pdf?src-supplier=LCSC; ComponentLink16URL: https://datasheet.octopart.com:443/SN74LVC1G240DBVR-Texas-Instruments-datasheet-159116654.pdf?src-supplier=LCSC; ComponentLink16Description: https://datasheet.octopart.com:443/SN74LVC1G240DBVR-Texas-Instruments-datasheet-159116654.pdf?src-supplier=LCSC; ComponentLink17URL: https://datasheet.octopart.com:443/SN74LVC1G240DBVR.-Texas-Instruments-datasheet-65857693.pdf?src-supplier=Farnell; ComponentLink17Description: https://datasheet.octopart.com:443/SN74LVC1G240DBVR.-Texas-Instruments-datasheet-65857693.pdf?src-supplier=Farnell; ComponentLink18URL: https://datasheet.octopart.com:443/SN74LVC1G240DBVR-Texas-Instruments-datasheet-14147971.pdf?src-supplier=iiiC; ComponentLink18Description: https://datasheet.octopart.com:443/SN74LVC1G240DBVR-Texas-Instruments-datasheet-14147971.pdf?src-supplier=iiiC; ComponentLink19URL: https://datasheet.octopart.com:443/SN74LVC1G240DBVR-Texas-Instruments-datasheet-8188908.pdf?src-supplier=Jameco; ComponentLink19Description: https://datasheet.octopart.com:443/SN74LVC1G240DBVR-Texas-Instruments-datasheet-8188908.pdf?src-supplier=Jameco; ComponentLink20URL: https://datasheet.octopart.com:443/SN74LVC1G240DBVR-Texas-Instruments-datasheet-12400.pdf?src-supplier=DigiKey; ComponentLink20Description: https://datasheet.octopart.com:443/SN74LVC1G240DBVR-Texas-Instruments-datasheet-12400.pdf?src-supplier=DigiKey; ComponentLink21URL: https://datasheet.octopart.com:443/SN74LVC1G240DBVR-Texas-Instruments-datasheet-116322.pdf?src-supplier=Sierra+IC; ComponentLink21Description: https://datasheet.octopart.com:443/SN74LVC1G240DBVR-Texas-Instruments-datasheet-116322.pdf?src-supplier=Sierra+IC; ComponentLink22URL: http://sigma.octopart.com:80/reach_statement/Texas-Instruments-company-64.pdf?src-supplier=Compliance+Statements; ComponentLink22Description: http://sigma.octopart.com:80/reach_statement/Texas-Instruments-company-64.pdf?src-supplier=Compliance+Statements; ComponentLink23URL: http://sigma.octopart.com:80/conflict_mineral_statement/Texas-Instruments-company-63.pdf?src-supplier=Compliance+Statements; ComponentLink23Description: http://sigma.octopart.com:80/conflict_mineral_statement/Texas-Instruments-company-63.pdf?src-supplier=Compliance+Statements
footprint SOT-23-5
pins: 1 ~{OE}, 2 IN, 3 GND, 4 Out, 5 VCC

## SN74LVC1T45DCKR
designator U?  (value not drawn)
Voltage Level Translator Bidirectional 1 Circuit 1 Channel 420Mbps SC-70-6; Manufacturer: Texas Instruments; Manufacturer Part Number: SN74LVC1T45DCKR; Max Supply Voltage: 5.5V; Min Supply Voltage: 1.65V; Number of Channels: 1; Propagation Delay: 3.9ns; Logic Function: Translator,Transceiver; High Level Output Current: -32mA; Low Level Output Current: 32mA; Quiescent Current: 3uA; Output Type: 3-STATE; Turn-On Delay Time: 17.7ns; Polarity: Non-Inverting; Supplier: Digi-Key; Supplier Part Number: 296-16844-1-ND; RoHS: Yes; Category: Logic ICs; Stock: 14469; Pricing: 1=0.72000, 10=0.63000, 25=0.59160, 100=0.48270, 250=0.44840, 500=0.38160, 1000=0.30528 (USD); Mounting Technology: Surface Mount; Case/Package: SC; Pins: 6; Weight: 8.8E-05oz; Contact Plating: Gold; Min Operating Temperature: -40°C; Max Operating Temperature: 85°C; Packaging: Tape and Reel; Data Rate: 420Mbps; Package Quantity: 1; Number of Bits: 1; Series: 74LVC; Technology: CMOS; Direction: Bidirectional; Number of Elements: 1; Channel Type: Bidirectional; Number of Circuits: 1; Length: 2.15mm; Width: 1.4mm; Height: 1mm; Radiation Hardening: No; Reach SVHC Compliant: Yes; Lead Free: Lead Free; RoHS Compliant: Yes; ComponentLink1URL: https://datasheet.ciiva.com/36526/2000557-36526242.pdf?src-supplier=Jameco; ComponentLink1Description: https://datasheet.ciiva.com/36526/2000557-36526242.pdf?src-supplier=Jameco; ComponentLink2URL: https://datasheet.ciiva.com/15086/getdatasheetpartid-190116-15086313.pdf?src-supplier=Verical; ComponentLink2Description: https://datasheet.ciiva.com/15086/getdatasheetpartid-190116-15086313.pdf?src-supplier=Verical; ComponentLink3URL: https://datasheet.ciiva.com/7293/1862463-7293671.pdf?src-supplier=Newark; ComponentLink3Description: https://datasheet.ciiva.com/7293/1862463-7293671.pdf?src-supplier=Newark; ComponentLink4URL: https://datasheet.ciiva.com/7744/1814968-7744166.pdf?src-supplier=Element14; ComponentLink4Description: https://datasheet.ciiva.com/7744/1814968-7744166.pdf?src-supplier=Element14; ComponentLink5URL: https://datasheet.ciiva.com/1899/sn74lvc1t45-1899258.pdf?src-supplier=Digi-Key; ComponentLink5Description: https://datasheet.ciiva.com/1899/sn74lvc1t45-1899258.pdf?src-supplier=Digi-Key; ComponentLink6URL: https://datasheet.ciiva.com/1899/sn74lvc1t45-1899257.pdf?src-supplier=Digi-Key; ComponentLink6Description: https://datasheet.ciiva.com/1899/sn74lvc1t45-1899257.pdf?src-supplier=Digi-Key; ComponentLink7URL: https://datasheet.ciiva.com/1899/sn74lvc1t45-1899259.pdf?src-supplier=Digi-Key; ComponentLink7Description: https://datasheet.ciiva.com/1899/sn74lvc1t45-1899259.pdf?src-supplier=Digi-Key; ComponentLink8URL: https://datasheet.ciiva.com/14300/sn74lvc1t45-14300773.pdf?src-supplier=Avnet; ComponentLink8Description: https://datasheet.ciiva.com/14300/sn74lvc1t45-14300773.pdf?src-supplier=Avnet; ComponentLink9URL: https://datasheet.ciiva.com/48703/001073763-da-01-en-ic-bus-trans-sn74lvc1t45dckr-sc-70-6-tid-48703349.pdf?src-supplier=Conrad; ComponentLink9Description: https://datasheet.ciiva.com/48703/001073763-da-01-en-ic-bus-trans-sn74lvc1t45dckr-sc-70-6-tid-48703349.pdf?src-supplier=Conrad
footprint SC-70-6
pins: 1 VCCA, 2 GND, 3 A, 4 B, 5 DIR, 6 VCCB

## SP336EEY-L
designator U?
Dual Transmitter/Receiver RS-232/RS-422/RS-485 28-Pin TSSOP Tube; Part Number: SP336EEY-L; Manufacturer: MaxLinear; Data Rate: 250Kbps; Simplex/Duplex: Full Duplex; Receiver Hysteresis: 500mV; Supplier: Digikey; Supplier Part Number: 1016-1141-ND; Manufacturer Part Number: SP336EEY-L; RoHS: Yes; Category: Integrated Circuits (ICs); Stock: 44; Pricing: 1=11.71, 10=9.182, 50=8.1708, 100=7.8576, 250=7.52688, 500=7.32754, 1000=7.16352 (USD); Mounting Technology: Surface Mount; Case/Package: TSSOP; Min Operating Temperature: -40°C; Max Operating Temperature: 85°C; Series: -; RoHS Compliant: Yes; ComponentLink1URL: https://www.exar.com/content/document.ashx?id=20073&src-supplier=Digikey; ComponentLink1Description: https://www.exar.com/content/document.ashx?id=20073&src-supplier=Digikey; ComponentLink2URL: https://datasheet.octopart.com/SP336EEY-L-Exar-datasheet-12512389.pdf?src-supplier=Future+Electronics; ComponentLink2Description: https://datasheet.octopart.com/SP336EEY-L-Exar-datasheet-12512389.pdf?src-supplier=Future+Electronics
footprint SP336EEY-L (Programmable 3.3/5V RS-232 / RS-485/RS-422 Serial Transceiver)
pins: 1 T4_IN, 2 MODE_1, 3 T4_OUT, 4 T3_OUT, 5 VCC (power), 6 T1_OUT, 7 T2_OUT, 8 GND, 9 C1+, 10 V+, 11 C2+, 12 C1-, 13 C2-, 14 V-, 15 R1_IN, 16 R2_IN, 17 R3_IN, 18 R4_IN, 19 R1_OUT, 20 R2_OUT, 21 R3_OUT, 22 R4_OUT, 23 MODE_2, 24 MODE_0, 25 SLEW, 26 T1_IN, 27 T2_IN, 28 T3_IN

## SP3232EBCN-L
designator U?
Line Transceiver, 2 Func, 2 Driver, 2 Rcvr, PDSO16, LEAD FREE, MS-012AC, NSOIC-16; Manufacturer: MaxLinear; Manufacturer Part Number: SP3232EBCN-L; Data Rate: 250kbps; Interface: RS-232; Low Level Output Current: 1.6mA; Max Supply Current: 1mA; Max Supply Voltage: 5.5V; Min Supply Voltage: 3V; Number of Circuits: 2; Number of I/Os: 4; Operating Supply Voltage: 3.3V; Propagation Delay: 0s; Supplier: RS; Supplier Part Number: 9134121; RoHS: Compliant; Category: Interface ICs; Stock: 120; Pricing: 49=0.754, 245=0.641, 980=0.566, 2450=0.49 (GBP); Case/Package: SOIC; Country of Origin: Mainland China; Export Control Classification Number (ECCN) Code: EAR99; Height: 1.65mm; Height - Seated (Max): 1.75mm; Harmonized Tariff Schedule (HTS) Code: 8542.39.00.60; Introduction Date: 2001-10-22; Lead Free: Lead Free; Length: 9.9mm; Lifecycle Status: Production; Logic Function: Transceiver; Max Operating Temperature: 70°C; Min Operating Temperature: 0°C; Nominal Supply Current: 1mA; Number of Drivers: 2; Pins: 16; Number of Receivers: 2; Number of Terminals: 16; Number of Transceivers: 2; Number of Transmitters: 2; Radiation Hardening: No; REACH SVHC: Yes; Temperature Grade: Commercial; Terminal Pitch: 1.27mm; Width: 3.9mm; ComponentLink1URL: https://datasheet.octopart.com:443/SP3232EBCN-L-MaxLinear-datasheet-180626191.pdf?src-supplier=IHS; ComponentLink1Description: https://datasheet.octopart.com:443/SP3232EBCN-L-MaxLinear-datasheet-180626191.pdf?src-supplier=IHS; ComponentLink2URL: https://datasheet.octopart.com:443/SP3232EBCN-L-MaxLinear-datasheet-78268301.pdf?src-supplier=IHS; ComponentLink2Description: https://datasheet.octopart.com:443/SP3232EBCN-L-MaxLinear-datasheet-78268301.pdf?src-supplier=IHS; ComponentLink3URL: https://datasheet.octopart.com:443/SP3232EBCN-L-MaxLinear-datasheet-62127776.pdf?src-supplier=Farnell; ComponentLink3Description: https://datasheet.octopart.com:443/SP3232EBCN-L-MaxLinear-datasheet-62127776.pdf?src-supplier=Farnell; ComponentLink4URL: https://datasheet.octopart.com:443/SP3232EBCN-L-Exar-datasheet-10064133.pdf?src-supplier=Newark; ComponentLink4Description: https://datasheet.octopart.com:443/SP3232EBCN-L-Exar-datasheet-10064133.pdf?src-supplier=Newark; ComponentLink5URL: https://datasheet.octopart.com:443/SP3232EBCN-L-Exar-datasheet-504596.pdf?src-supplier=RS+(Formerly+Allied+Electronics); ComponentLink5Description: https://datasheet.octopart.com:443/SP3232EBCN-L-Exar-datasheet-504596.pdf?src-supplier=RS+(Formerly+Allied+Electronics); ComponentLink6URL: https://datasheet.octopart.com:443/SP3232EBCN-L-MaxLinear-datasheet-157103659.pdf?src-supplier=ODG+(Origin+Data+Global); ComponentLink6Description: https://datasheet.octopart.com:443/SP3232EBCN-L-MaxLinear-datasheet-157103659.pdf?src-supplier=ODG+(Origin+Data+Global); ComponentLink7URL: https://datasheet.octopart.com:443/SP3232EBCN-L-Exar-datasheet-24580155.pdf?src-supplier=Future+Electronics; ComponentLink7Description: https://datasheet.octopart.com:443/SP3232EBCN-L-Exar-datasheet-24580155.pdf?src-supplier=Future+Electronics; ComponentLink8URL: https://datasheet.octopart.com:443/SP3232EBCN-L-Exar-datasheet-12512939.pdf?src-supplier=Future+Electronics; ComponentLink8Description: https://datasheet.octopart.com:443/SP3232EBCN-L-Exar-datasheet-12512939.pdf?src-supplier=Future+Electronics; ComponentLink9URL: https://datasheet.octopart.com:443/SP3232EBCN-L-Exar-datasheet-11474765.pdf?src-supplier=Arrow+Electronics; ComponentLink9Description: https://datasheet.octopart.com:443/SP3232EBCN-L-Exar-datasheet-11474765.pdf?src-supplier=Arrow+Electronics; ComponentLink10URL: https://datasheet.octopart.com:443/SP3232EBCN-L-Exar-datasheet-14122651.pdf?src-supplier=iiiC; ComponentLink10Description: https://datasheet.octopart.com:443/SP3232EBCN-L-Exar-datasheet-14122651.pdf?src-supplier=iiiC; ComponentLink11URL: https://datasheet.octopart.com:443/SP3232EBCN-L-Exar-datasheet-57411.pdf?src-supplier=element14; ComponentLink11Description: https://datasheet.octopart.com:443/SP3232EBCN-L-Exar-datasheet-57411.pdf?src-supplier=element14
footprint SOIC16N_SSOP16_3P9X9P9_MXL
pins: 1 C1+ (io), 2 V+ (power), 3 C1- (io), 4 C2+ (io), 5 C2- (io), 6 V- (power), 7 T2OUT (out), 8 R2IN (in), 9 R2OUT (out), 10 T2IN (in), 11 T1IN (in), 12 R1OUT (out), 13 R1IN (in), 14 T1OUT (out), 15 GND (power), 16 VCC (power)

## SPM6530T-1R5M100
designator L?  value 1.5uH  (hidden comment: *)
Inductor Power Shielded Wirewound 1.5uH 20% 100KHz Metal 11A 10.67mOhm DCR Blister T/R; Manufacturer: TDK; Manufacturer Part Number: SPM6530T-1R5M100; Saturation Current: 11.5A; DC Resistance (DCR): 10.67mR; Max DC Current: 1.5A; Supplier: Digi-Key; Supplier Part Number: 445-3881-1-ND; RoHS: Yes; Category: Fixed Inductors; Stock: 21070; Pricing: 1=1.26000, 10=1.17200, 25=1.08160, 50=0.90120, 100=0.84720, 250=0.75704, 500=0.64890 (USD); Mounting Technology: Surface Mount; Case/Package: Nonstandard; Pins: 2; Core Material: Metal; Min Operating Temperature: -40°C; Max Operating Temperature: 125°C; Package Quantity: 1000; Current Rating: 11A; Tolerance: 20%; Shielding: Shielded; Packaging: Tape and Reel; Inductance Tolerance: 20%; Resistor Type: Wirewound; Test Frequency: 100kHz; Termination: SMD/SMT; RMS Current (Irms): 11A; DC Current: 11A; Series: SPM; Length: 0.28inch; Width: 0.256inch; Height: 3mm; Height - Seated (Max): 0.118inch; Depth: 6.8mm; Radiation Hardening: No; Reach SVHC Compliant: Yes; Military Standard: Not; RoHS Compliant: Yes; ComponentLink1URL: https://datasheet.ciiva.com/1047/e531-spm-1047424.pdf?src-supplier=Digi-Key; ComponentLink1Description: https://datasheet.ciiva.com/1047/e531-spm-1047424.pdf?src-supplier=Digi-Key; ComponentLink2URL: https://datasheet.ciiva.com/22729/e531-spm-22729326.pdf?src-supplier=Element14; ComponentLink2Description: https://datasheet.ciiva.com/22729/e531-spm-22729326.pdf?src-supplier=Element14; ComponentLink3URL: https://datasheet.ciiva.com/8045/1649093-8045739.pdf?src-supplier=Element14; ComponentLink3Description: https://datasheet.ciiva.com/8045/1649093-8045739.pdf?src-supplier=Element14; ComponentLink4URL: https://datasheet.ciiva.com/1047/e531-spm-1047423.pdf?src-supplier=Digi-Key; ComponentLink4Description: https://datasheet.ciiva.com/1047/e531-spm-1047423.pdf?src-supplier=Digi-Key; ComponentLink5URL: https://datasheet.ciiva.com/1047/e531-spm-1047422.pdf?src-supplier=Digi-Key; ComponentLink5Description: https://datasheet.ciiva.com/1047/e531-spm-1047422.pdf?src-supplier=Digi-Key; ComponentLink6URL: https://datasheet.ciiva.com/8498/e531-spm-8498181.pdf?src-supplier=Avnet; ComponentLink6Description: https://datasheet.ciiva.com/8498/e531-spm-8498181.pdf?src-supplier=Avnet; ComponentLink7URL: https://datasheet.ciiva.com/15992/e531-spm6530-15992138.pdf?src-supplier=Onlinecomponents.com; ComponentLink7Description: https://datasheet.ciiva.com/15992/e531-spm6530-15992138.pdf?src-supplier=Onlinecomponents.com
footprint SPM6530T-1R5M100
pins: 1 B, 2 A

## SPM6530T-100M
designator L?  (value not drawn)
Ind Power Shielded Wirewound 10uH 20% 100kHz Metal 3.6A T/R; Manufacturer: TDK; Manufacturer Part Number: SPM6530T-100M; Supplier: Rs; Supplier Part Number: 1346234P; RoHS: Yes; Category: Fixed Inductors; Stock: 500; Pricing: 50=1.08, 100=0.998, 200=0.942, 400=0.856 (EUR); ComponentLink1URL: https://datasheet.octopart.com/SPM6530T-100M-TDK-datasheet-73765661.pdf?src-supplier=Newark; ComponentLink1Description: https://datasheet.octopart.com/SPM6530T-100M-TDK-datasheet-73765661.pdf?src-supplier=Newark; Value: 10uH
footprint SPM6530T-100M
pins: 1 B, 2 A

## SQ2389ES-T1_GE3
designator Q?  (value not drawn)
P-Channel 60 V 0.94 Ohm 12 nC SMT Automotive Power Mosfet - SOT-23; Manufacturer: Vishay; Manufacturer Part Number: SQ2389ES-T1_GE3; Supplier: Mouser; Supplier Part Number: 78-SQ2389ES-T1_GE3; RoHS: Yes; Category: MOSFETs; Stock: 32123; Pricing: 1=0.56, 10=0.557, 50=0.557, 100=0.406, 1000=0.294, 10000=0.218 (USD)
footprint SOT-23-3
pins: 1 G, 2 S, 3 D
